# Altium footprint library Components.PcbLib: 260 footprints (part 12 of 17)
Each footprint in its own frame and in the unit in brackets; x right, y up, seen from the top. Pads: shape width x height; smd on the part's side, far side on the other; paste and mask are expansions set on the pad; w line width, h text height; cw(c..) or ccw(c..) is an arc to the next point about the centre after c.
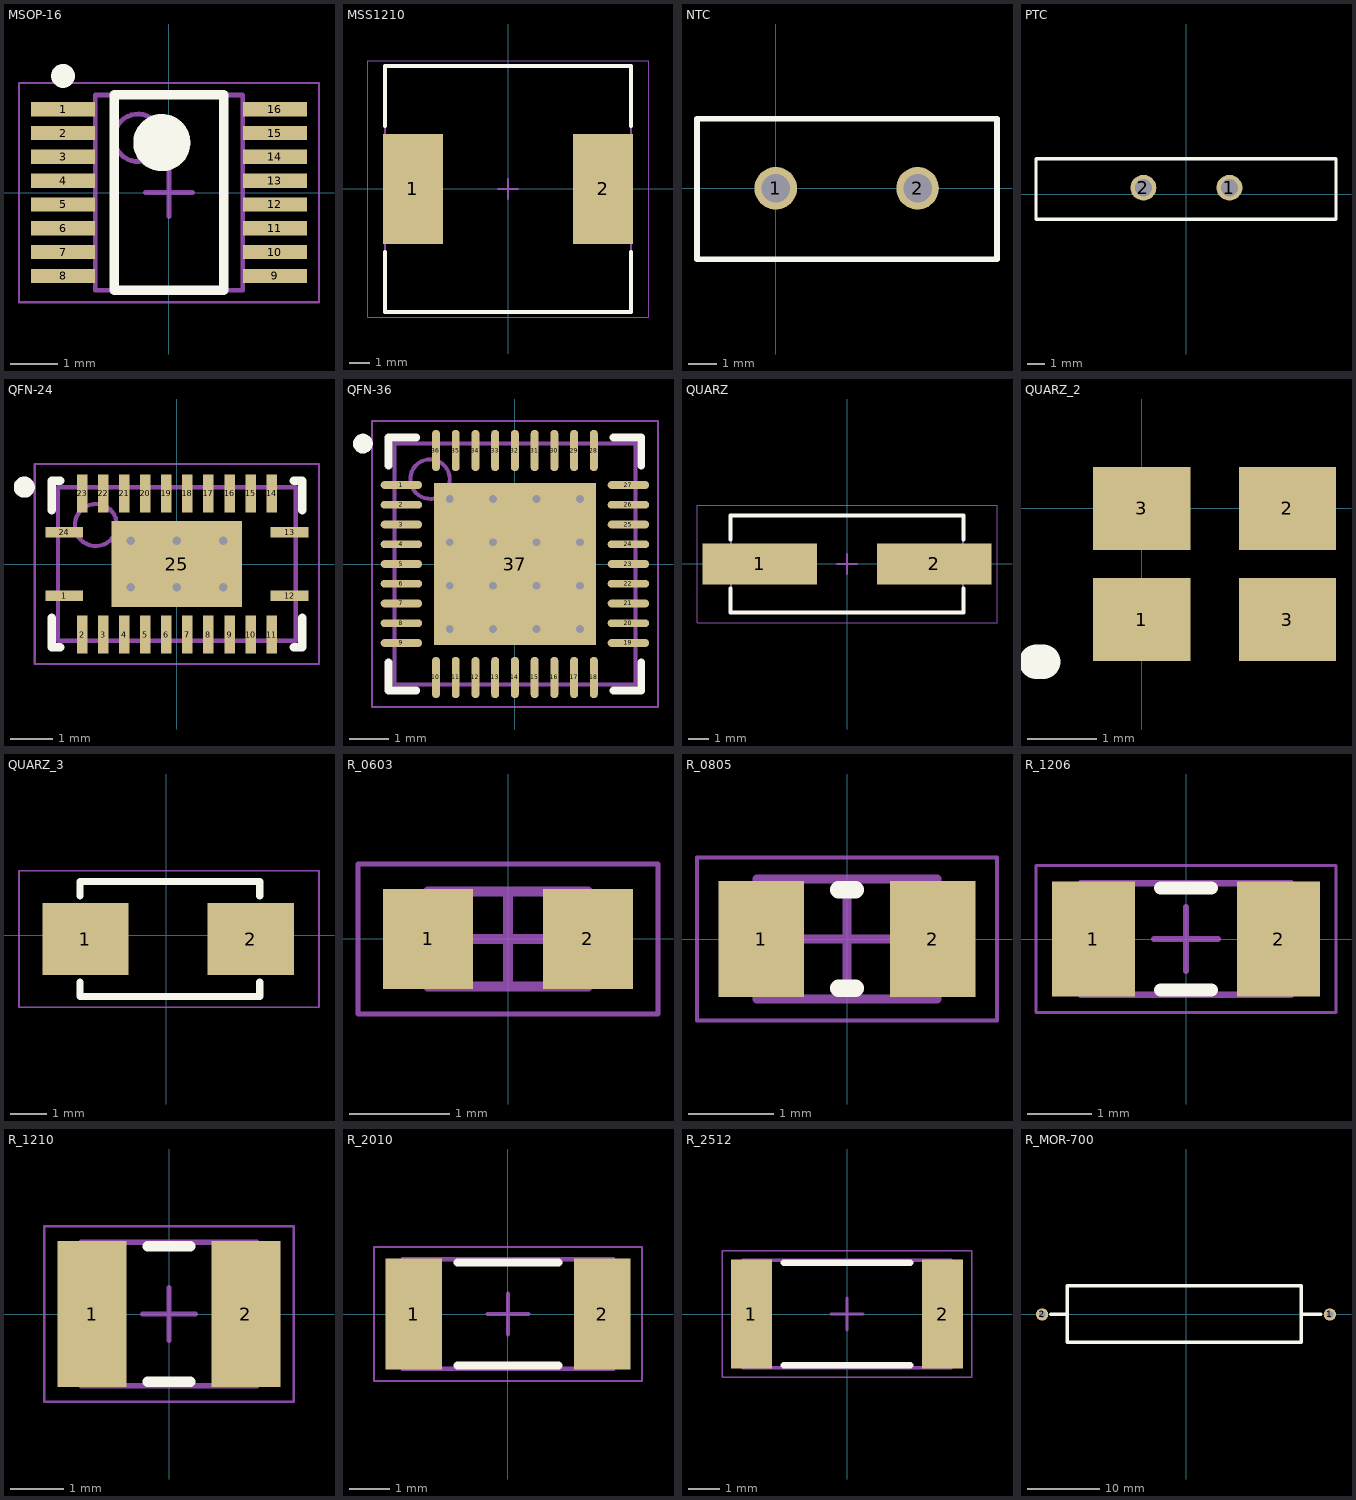
[diagram p11: the footprints below, top view; thin cyan lines are the x and y axes]

## MSOP-16 [mm]
height 1.1
pads (16):
  rect 1.35x0.3 smd: 1(-2.225,1.75) 2(-2.225,1.25) 3(-2.225,0.75) 4(-2.225,0.25) 5(-2.225,-0.25) 6(-2.225,-0.75) 7(-2.225,-1.25) 8(-2.225,-1.75) 9(2.225,-1.75) 10(2.225,-1.25) 11(2.225,-0.75) 12(2.225,-0.25) 13(2.225,0.25) 14(2.225,0.75) 15(2.225,1.25) 16(2.225,1.75)
Top Overlay:
  circle w0.25: c-2.225,2.45 r0.125
  circle w0.6: c-0.15,1.05 r0.3
  lines w0.2: -1.15,-2.05 -1.15,2.05 1.15,2.05 1.15,-2.05 -1.15,-2.05
Mechanical 13:
  circle w0.1: c-0.65,1.15 r0.5
  lines w0.1: -1.55,-2.05 -1.55,2.05 1.55,2.05 1.55,-2.05 -1.55,-2.05
Mechanical 15:
  lines w0.05: -3.15,-2.3 -3.15,2.3 3.15,2.3 3.15,-2.3 -3.15,-2.3
  lines w0.1: -0.5,0 0.5,0 ; 0,-0.5 0,0.5
3D body "MSOP-16.step": height 0.96, standoff 0.1, extent -2.45,-2.02 2.45,2.019

## MSS1210 [mm] "Precision Wire Wound Inductor, 2-Leads, Body 12,30x12,30mm, IPC Medium Density"
height 10.2
pads (2):
  rect 3x5.5 smd: 1(-4.75,0) 2(4.75,0)
Top Overlay:
  lines w0.2: -6.15,-3.15 -6.15,-6.15 6.15,-6.15 6.15,-3.15 ; -6.15,3.15 -6.15,6.15 6.15,6.15 6.15,3.15
Mechanical 13:
  lines w0.1: -6.15,-6.15 6.15,-6.15 6.15,6.15 -6.15,6.15 -6.15,-6.15
Mechanical 15:
  lines w0.05: -7.025,-6.4 7.025,-6.4 7.025,6.4 -7.025,6.4 -7.025,-6.4
  lines w0.1: -0.5,0 0.5,0 ; 0,-0.5 0,0.5
3D body "Coilcraft-MSS1210.step": height 10.16, standoff -0.04, extent -6.2,-6.3 6.1,6

## NTC [mm]
pads (2):
  round 1.5 hole 1: 1(0,0) 2(5,0)
Top Overlay:
  lines w0.2: -2.775,-2.5 -2.775,2.45 7.8,2.45 7.8,-2.5 -2.775,-2.5
3D body: height 0, standoff -3, extent 4.7,-0.299 5.3,0.3
3D body: height 0, standoff -3, extent -0.3,-0.299 0.3,0.3
3D body: height 5, standoff 0, extent 4,-1 6,1
3D body: height 5, standoff 0, extent -1,-1 1,1
3D body: height 11.25, standoff 0.75, extent -2.775,-2.5 7.725,2.5

## PTC [mm]
pads (2):
  round 1.5 hole 1: 1(2.5,0.375) 2(-2.5,0.375)
Top Overlay:
  lines w0.2: -8.741,-1.45 8.691,-1.45 8.691,2.05 -8.741,2.05 -8.741,-1.45
3D body: height 0, standoff -3, extent -2.8,0.075 -2.2,0.675
3D body: height 0, standoff -3, extent 2.2,0.075 2.8,0.675
3D body: height 5, standoff 0, extent -3.5,-0.625 -1.5,1.375
3D body: height 5, standoff 0, extent 1.5,-0.625 3.5,1.375
3D body: height 19.75, standoff 2.25, extent -8.74,-1.425 8.76,2.075

## QFN-24 [mm] "QFN, 24-Leads, Body 5,50x3,50mm, Pitch 0,50mm/1,50mm, Thermal Pad 3,10x2,05mm, IPC Medium Density"
height 1
pads (25):
  rect 0.9x0.25 smd: 1(-2.675,-0.75) 12(2.675,-0.75) 13(2.675,0.75) 24(-2.675,0.75)
  rect 0.25x0.9 smd: 2(-2.25,-1.675) 3(-1.75,-1.675) 4(-1.25,-1.675) 5(-0.75,-1.675) 6(-0.25,-1.675) 7(0.25,-1.675) 8(0.75,-1.675) 9(1.25,-1.675) 10(1.75,-1.675) 11(2.25,-1.675) 14(2.25,1.675) 15(1.75,1.675) 16(1.25,1.675) 17(0.75,1.675) 18(0.25,1.675) 19(-0.25,1.675) 20(-0.75,1.675) 21(-1.25,1.675) 22(-1.75,1.675) 23(-2.25,1.675)
  rect 3.1x2.05 smd: 25(0,0)
via -1.1,0.55 diameter 0.5 hole 0.2
via 0,0.55 diameter 0.5 hole 0.2
via 1.1,0.55 diameter 0.5 hole 0.2
via -1.1,-0.55 diameter 0.5 hole 0.2
via 0,-0.55 diameter 0.5 hole 0.2
via 1.1,-0.55 diameter 0.5 hole 0.2
Top Overlay:
  circle w0.25: c-3.625,1.825 r0.125
  lines w0.2: -2.975,-1.275 -2.975,-1.975 -2.775,-1.975 ; -2.975,1.275 -2.975,1.975 -2.775,1.975 ; 2.775,-1.975 2.975,-1.975 2.975,-1.275 ; 2.775,1.975 2.975,1.975 2.975,1.275
Mechanical 13:
  circle w0.1: c-1.925,0.925 r0.5
  lines w0.1: -2.825,-1.825 -2.825,1.825 2.825,1.825 2.825,-1.825 -2.825,-1.825
Mechanical 15:
  lines w0.05: -3.375,-2.375 -3.375,2.375 3.375,2.375 3.375,-2.375 -3.375,-2.375
  lines w0.1: -0.5,0 0.5,0 ; 0,-0.5 0,0.5
3D body: height 1, standoff 0, extent -2.825,-1.825 2.825,1.825

## QFN-36 [mm] "QFN, 36-Leads, Body 6,00x6,00mm, Pitch 0,50mm, Thermal Pad 4,10x4,10mm, IPC Medium Density"
height 0.9
pads (37):
  oval 1.05x0.2 smd: 1(-2.875,2) 2(-2.875,1.5) 3(-2.875,1) 4(-2.875,0.5) 5(-2.875,0) 6(-2.875,-0.5) 7(-2.875,-1) 8(-2.875,-1.5) 9(-2.875,-2) 19(2.875,-2) 20(2.875,-1.5) 21(2.875,-1) 22(2.875,-0.5) 23(2.875,0) 24(2.875,0.5) 25(2.875,1) 26(2.875,1.5) 27(2.875,2)
  oval 0.2x1.05 smd: 10(-2,-2.875) 11(-1.5,-2.875) 12(-1,-2.875) 13(-0.5,-2.875) 14(0,-2.875) 15(0.5,-2.875) 16(1,-2.875) 17(1.5,-2.875) 18(2,-2.875) 28(2,2.875) 29(1.5,2.875) 30(1,2.875) 31(0.5,2.875) 32(0,2.875) 33(-0.5,2.875) 34(-1,2.875) 35(-1.5,2.875) 36(-2,2.875)
  rect 4.1x4.1 smd: 37(0,0)
via 1.65,-1.65 diameter 0.5 hole 0.2
via 0.55,-1.65 diameter 0.5 hole 0.2
via -0.55,-1.65 diameter 0.5 hole 0.2
via -1.65,-1.65 diameter 0.5 hole 0.2
via 1.65,-0.55 diameter 0.5 hole 0.2
via 0.55,-0.55 diameter 0.5 hole 0.2
via -0.55,-0.55 diameter 0.5 hole 0.2
via -1.65,-0.55 diameter 0.5 hole 0.2
via 1.65,0.55 diameter 0.5 hole 0.2
via 0.55,0.55 diameter 0.5 hole 0.2
via -0.55,0.55 diameter 0.5 hole 0.2
via -1.65,0.55 diameter 0.5 hole 0.2
via 1.65,1.65 diameter 0.5 hole 0.2
via 0.55,1.65 diameter 0.5 hole 0.2
via -0.55,1.65 diameter 0.5 hole 0.2
via -1.65,1.65 diameter 0.5 hole 0.2
Top Overlay:
  circle w0.25: c-3.85,3.05 r0.125
  lines w0.2: -3.2,-2.5 -3.2,-3.2 -2.5,-3.2 ; -3.2,2.5 -3.2,3.2 -2.5,3.2 ; 2.5,-3.2 3.2,-3.2 3.2,-2.5 ; 2.5,3.2 3.2,3.2 3.2,2.5
Mechanical 13:
  circle w0.1: c-2.15,2.15 r0.5
  lines w0.1: -3.05,-3.05 3.05,-3.05 3.05,3.05 -3.05,3.05 -3.05,-3.05
Mechanical 15:
  lines w0.05: -3.625,-3.625 3.625,-3.625 3.625,3.625 -3.625,3.625 -3.625,-3.625
  lines w0.1: -0.5,0 0.5,0 ; 0,-0.5 0,0.5
3D body: height 0.9, standoff 0, extent -3.05,-3.05 3.05,3.05

## QUARZ [mm]
height 4.1
pads (2):
  rect 5.65x2 smd: 1(-4.3,0) 2(4.3,0)
Top Overlay:
  lines w0.2: -5.75,-1.2 -5.75,-2.4 5.75,-2.4 5.75,-1.2 ; -5.75,1.2 -5.75,2.4 5.75,2.4 5.75,1.2
Mechanical 13:
  lines w0.1: -5.725,-2.4 -5.725,2.4 5.725,2.4 5.725,-2.4 -5.725,-2.4
Mechanical 15:
  lines w0.05: -7.4,-2.9 -7.4,2.9 7.4,2.9 7.4,-2.9 -7.4,-2.9
  lines w0.1: -0.5,0 0.5,0 ; 0,-0.5 0,0.5
3D body "HC49.step": height 4, standoff 0, extent -6.25,-2.4 6.25,2.4

## QUARZ_2 [mm]
pads (4):
  rect 1.4x1.2 smd: 1(0,-1.6) 2(2.1,0) 3(0,0) 3(2.1,-1.6)
Top Overlay:
  lines w0.5: -1.524,-2.21 -1.422,-2.21
3D body "NXK-3225.step": height 0.6, standoff 0, extent -0.55,-2.05 2.65,0.45

## QUARZ_3 [mm]
pads (2):
  rect 2.4x2 smd: 1(-2.25,-0.1) 2(2.35,-0.1)
Top Overlay:
  lines w0.2: -2.4,-1.3 -2.4,-1.7 2.6,-1.7 2.6,-1.3 ; -2.4,1.1 -2.4,1.5 2.4,1.5 2.6,1.5 ; 2.6,1.1 2.6,1.5 ; 2.6,1.5 2.6,1.5
Mechanical 15:
  lines w0.05: -4.1,-2 -3.1,-2 4.25,-2 4.25,1.8 -4.1,1.8 -4.1,-2

## R_0603 [mm] "Chip Resistor, 2-Leads, Body 1,60x0,80mm, IPC Medium Density"
height 0.55
pads (2):
  rect 0.9x1 smd: 1(-0.8,0) 2(0.8,0)
Mechanical 13:
  lines w0.1: -0.8,-0.475 0.8,-0.475 0.8,0.475 -0.8,0.475 -0.8,-0.475
Mechanical 15:
  lines w0.05: -1.5,-0.75 1.5,-0.75 1.5,0.75 -1.5,0.75 -1.5,-0.75
  lines w0.1: -0.475,0 0.475,0 ; 0,-0.475 0,0.475
3D body "R0603.step": height 0.44, standoff -0.02, extent -0.8,-0.4 0.8,0.4

## R_0805 [mm] "Chip Resistor, 2-Leads, Body 2,00x1,25mm, IPC Medium Density"
height 0.55
pads (2):
  rect 1x1.35 smd: 1(-1,0) 2(1,0)
Top Overlay:
  lines w0.2: -0.1,-0.575 0.1,-0.575 ; -0.1,0.575 0.1,0.575
Mechanical 13:
  lines w0.1: -1.05,-0.7 -1.05,0.7 1.05,0.7 1.05,-0.7 -1.05,-0.7
Mechanical 15:
  lines w0.05: -1.75,-0.95 -1.75,0.95 1.75,0.95 1.75,-0.95 -1.75,-0.95
  lines w0.1: -0.5,0 0.5,0 ; 0,-0.5 0,0.5
3D body "R0805.step": height 0.59, standoff -0.01, extent -1,-0.625 1,0.625

## R_1206 [mm] "Chip Resistor, 2-Leads, Body 3,20x1,60mm, IPC Medium Density"
height 0.65
pads (2):
  rect 1.3x1.8 smd: 1(-1.45,0) 2(1.45,0)
Top Overlay:
  lines w0.2: -0.4,-0.8 0.4,-0.8 ; -0.4,0.8 0.4,0.8
Mechanical 13:
  lines w0.1: -1.65,-0.875 -1.65,0.875 1.65,0.875 1.65,-0.875 -1.65,-0.875
Mechanical 15:
  lines w0.05: -2.35,-1.15 -2.35,1.15 2.35,1.15 2.35,-1.15 -2.35,-1.15
  lines w0.1: -0.5,0 0.5,0 ; 0,-0.5 0,0.5
3D body "R1206.step": height 0.59, standoff -0.01, extent -1.6,-0.8 1.6,0.8

## R_1210 [mm] "Chip Resistor, 2-Leads, Body 3,20x2,50mm, IPC Medium Density"
height 0.65
pads (2):
  rect 1.3x2.75 smd: 1(-1.45,0) 2(1.45,0)
Top Overlay:
  lines w0.2: -0.4,-1.275 0.4,-1.275 ; -0.4,1.275 0.4,1.275
Mechanical 13:
  lines w0.1: -1.65,-1.35 -1.65,1.35 1.65,1.35 1.65,-1.35 -1.65,-1.35
Mechanical 15:
  lines w0.05: -2.35,-1.65 -2.35,1.65 2.35,1.65 2.35,-1.65 -2.35,-1.65
  lines w0.1: -0.5,0 0.5,0 ; 0,-0.5 0,0.5
3D body "R1210.step": height 0.59, standoff -0.01, extent -1.6,-1.25 1.6,1.25

## R_2010 [mm] "Chip Resistor, 2-Leads, Body 5,00x2,50mm, IPC Medium Density"
height 0.7
pads (2):
  rect 1.4x2.75 smd: 1(-2.325,0) 2(2.325,0)
Top Overlay:
  lines w0.2: -1.25,-1.275 1.25,-1.275 ; -1.25,1.275 1.25,1.275
Mechanical 13:
  lines w0.1: -2.6,-1.35 2.6,-1.35 2.6,1.35 -2.6,1.35 -2.6,-1.35
Mechanical 15:
  lines w0.05: -3.3,-1.65 3.3,-1.65 3.3,1.65 -3.3,1.65 -3.3,-1.65
  lines w0.1: -0.5,0 0.5,0 ; 0,-0.5 0,0.5
3D body "R2010.step": height 0.59, standoff -0.01, extent -2.5,-1.25 2.5,1.25

## R_2512 [mm] "Chip Resistor, 2-Leads, Body 6,40x3,20mm, IPC Medium Density"
height 0.7
pads (2):
  rect 1.3x3.45 smd: 1(-3.025,0) 2(3.025,0)
Top Overlay:
  lines w0.2: -2,-1.625 2,-1.625 ; -2,1.625 2,1.625
Mechanical 13:
  lines w0.1: -3.3,-1.7 -3.3,1.7 3.3,1.7 3.3,-1.7 -3.3,-1.7
Mechanical 15:
  lines w0.05: -3.95,-2 -3.95,2 3.95,2 3.95,-2 -3.95,-2
  lines w0.1: -0.5,0 0.5,0 ; 0,-0.5 0,0.5
3D body "R2512.step": height 0.59, standoff -0.01, extent -3.2,-1.6 3.2,1.6

## R_MOR-700 [mm] "Through hole resistor"
pads (2):
  round 1.7 hole 1: 1(20,0) 2(-20,0)
Top Overlay:
  lines w0.5: -18.8,0 -16.5,0 ; 18.725,0 16,0 ; -16.5,0 -16.5,3.975 16,3.975 16,0 ; -16.5,0 -16.5,-3.85 16,-3.85 16,0